# Altium footprint library jointbar.PCBLIB: 166 footprints (part 6 of 11)
Each footprint in its own frame and in the unit in brackets; x right, y up, seen from the top. Pads: shape width x height; smd on the part's side, far side on the other; paste and mask are expansions set on the pad; w line width, h text height; cw(c..) or ccw(c..) is an arc to the next point about the centre after c.
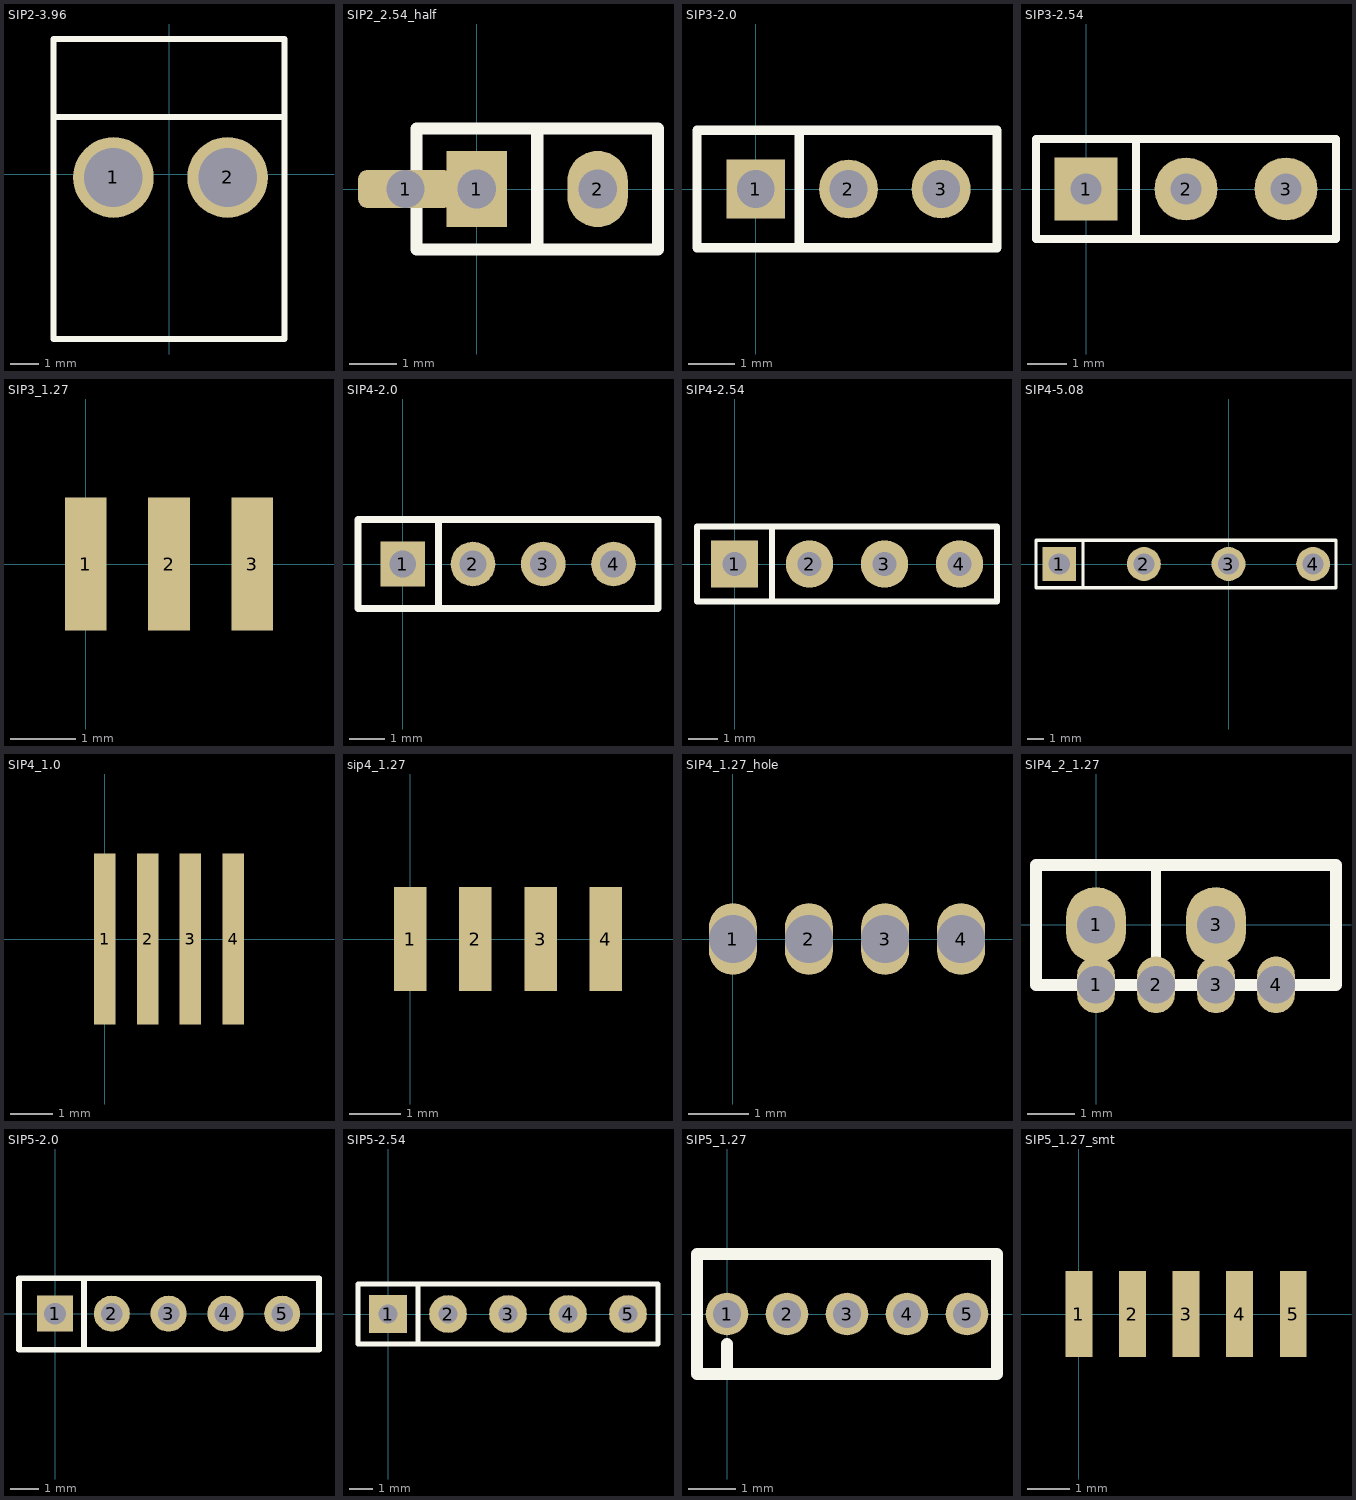
[diagram p5: the footprints below, top view; thin cyan lines are the x and y axes]

## SIP2-3.96 [mil]
pads (2):
  round 110 hole 80: 1(-75.91,-4.25) 2(80,-4.25)
TopOverlay:
  lines w8: -157.48,78.42 157.48,78.42 ; -157.48,-224.72 -157.48,184.72 157.48,184.72 157.48,-224.72 -157.48,-224.72

## SIP2_2.54_half [mm]
pads (3):
  rrect50% 2x0.8 hole 0.8: 1(-1.5,0)
  rect 1.27x1.6 hole 0.813: 1(0,0)
  oval 1.27x1.6 hole 0.813: 2(2.54,0)
TopOverlay:
  lines w0.254: 1.27,-1.27 1.27,1.27 ; -1.27,-1.27 3.81,-1.27 3.81,1.27 -1.27,1.27 -1.27,-1.27

## SIP3-2.0 [mil]
pads (3):
  rect 50x50 hole 32: 1(0,0)
  round 50 hole 32: 2(78.74,0) 3(157.48,0)
TopOverlay:
  lines w8: 37,50 37,-49 38,-50 ; -50,-50 205,-50 205,50 -50,50 -50,-50

## SIP3-2.54 [mm]
pads (3):
  rect 1.6x1.6 hole 0.8: 1(0,0)
  round 1.6 hole 0.8: 2(2.54,0) 3(5.08,0)
TopOverlay:
  lines w0.203: 1.27,-1.27 1.27,1.27 ; -1.27,-1.27 6.35,-1.27 6.35,1.27 -1.27,1.27 -1.27,-1.27

## SIP3_1.27 [mil]
pads (3):
  rect 25x80 smd: 1(0,0) 2(50,0) 3(100,0)

## SIP4-2.0 [mil]
pads (4):
  rect 50x50 hole 30: 1(0,0)
  round 50 hole 30: 2(78.74,0) 3(157.48,0) 4(236.22,0)
TopOverlay:
  lines w8: 40,-50 40,50 ; -50,-50 -50,50 286,50 286,-50 -50,-50

## SIP4-2.54 [mm]
pads (4):
  rect 1.6x1.6 hole 0.8: 1(0,0)
  round 1.6 hole 0.8: 2(2.54,0) 3(5.08,0) 4(7.62,0)
TopOverlay:
  lines w0.203: 1.27,-1.27 1.27,1.27 ; -1.27,-1.27 -1.27,1.27 8.89,1.27 8.89,-1.27 -1.27,-1.27

## SIP4-5.08 [mil]
pads (4):
  rect 80x80 hole 50: 1(-400,0)
  round 80 hole 50: 2(-200,0) 3(0,0) 4(200,0)
TopOverlay:
  lines w8: -455,-56 254,-56 254,56 -455,56 ; -455,-55 -455,55 ; -344,-56 -344,56

## SIP4_1.0 [mm]
pads (4):
  rect 0.5x4 smd: 1(0,0) 2(1,0) 3(2,0) 4(3,0)

## sip4_1.27 [mil]
pads (4):
  rect 25x80 smd: 1(0,0) 2(50,0) 3(100,0) 4(150,0)

## SIP4_1.27_hole [mm]
pads (4):
  oval 0.8x1.2 hole 0.8: 1(0,0) 2(1.27,0) 3(2.54,0) 4(3.81,0)

## SIP4_2_1.27 [mm]
pads (6):
  oval 0.8x1.2 hole 0.8: 1(0,-1.27) 2(1.27,-1.27) 3(2.54,-1.27) 4(3.81,-1.27)
  oval 1.27x1.6 hole 0.8: 1(0,0) 3(2.54,0)
TopOverlay:
  lines w0.203: 1.27,-1.27 1.27,1.27
  lines w0.254: -1.27,-1.27 -1.27,1.27 5.08,1.27 5.08,-1.27 -1.27,-1.27

## SIP5-2.0 [mil]
pads (5):
  rect 50x50 hole 30: 1(0,0)
  round 50 hole 30: 2(78.74,0) 3(157.48,0) 4(236.22,0) 5(314.96,0)
TopOverlay:
  lines w8: 40,-50 40,47 ; -50,-50 366,-50 366,49 -50,49 -50,-50

## SIP5-2.54 [mm]
pads (5):
  rect 1.6x1.6 hole 0.8: 1(0,0)
  round 1.6 hole 0.8: 2(2.54,0) 3(5.08,0) 4(7.62,0) 5(10.16,0)
TopOverlay:
  lines w0.203: 1.27,-1.27 1.27,1.27 ; -1.27,-1.27 11.43,-1.27 11.43,1.27 -1.27,1.27 -1.27,-1.27

## SIP5_1.27 [mm]
pads (5):
  round 0.9 hole 0.6: 1(0,0) 2(1.27,0) 3(2.54,0) 4(3.81,0) 5(5.08,0)
TopOverlay:
  lines w0.254: 0,-1.27 0,-0.635 ; -0.635,-1.27 5.715,-1.27 5.715,1.27 -0.635,1.27 -0.635,-1.27

## SIP5_1.27_smt [mil]
pads (5):
  rect 25x80 smd: 1(0,0) 2(50,0) 3(100,0) 4(150,0) 5(200,0)